# Altium integrated library Altium_WR-BHD (rev21a).IntLib: 216 symbols (part 2 of 2)
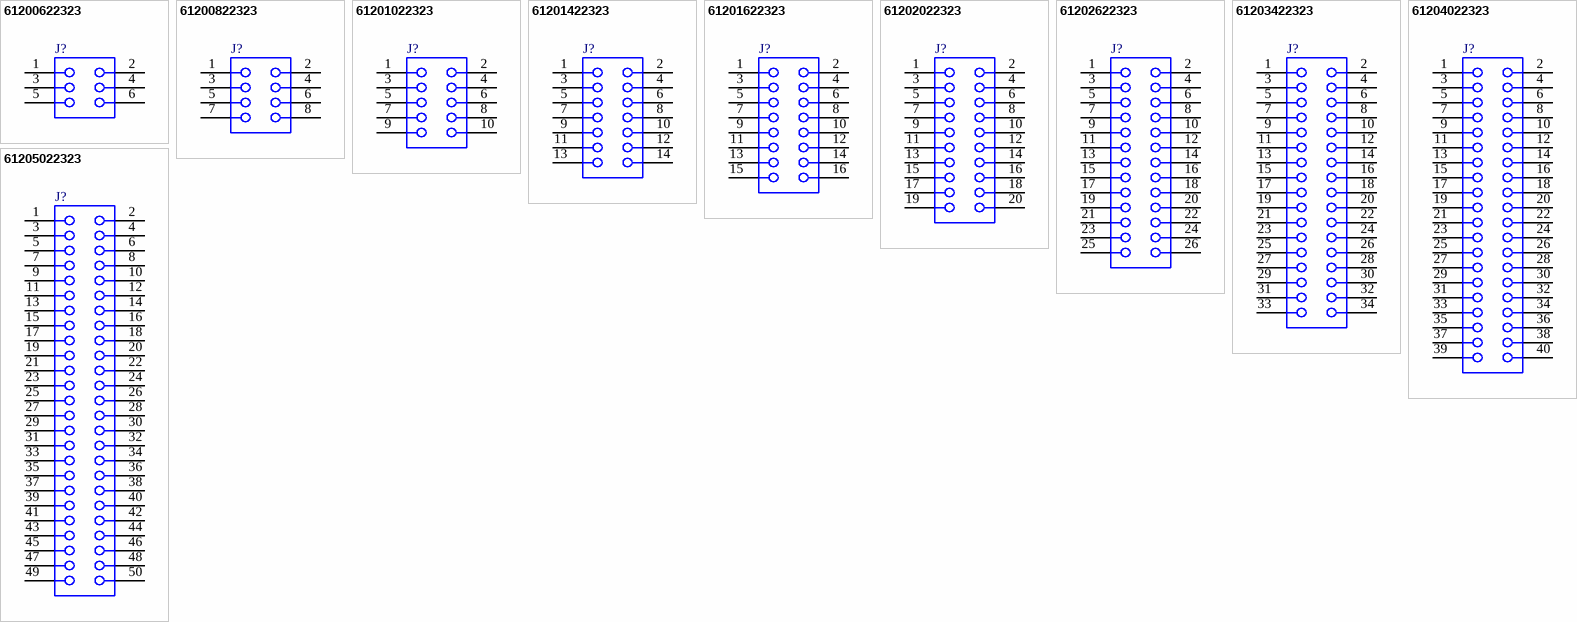
[diagram p9: symbols 61200622323 to 61205022323]

## 61203422323
designator J?
WR-BHD Box Header, Female Cable Side, pitch 2.54mm, THT, Straight, 34p; Manufacturer Part Number: 61203422323; Manufacturer: Wurth Elektronik; Pin Number: 34; Contact Resistance: 20mOhm; Working Voltage: 250VAC; Insulation Resistance: 1000MOhm; Rated Current: 1A; Withstanding Voltage: 500VAC; ComponentLink1Description: Manufacturer; ComponentLink1URL: http://www.we-online.de; ComponentLink2Description: Datasheet; ComponentLink2URL: https://www.we-online.com/catalog/datasheet/61203422323.pdf; Published Date: August 2021; Pitch: 2.54mm; Operating Temperature: -40 to +105degC; Mounting Technology: THT; Packaging: Tray; Gender: Female Cable Side; Length: 48.63mm; Type: Straight
footprint 61203422323
pins: 1, 2, 3, 4, 5, 6, 7, 8, 9, 10, 11, 12, 13, 14, 15, 16, 17, 18, 19, 20, 21, 22, 23, 24, 25, 26, 27, 28, 29, 30, 31, 32, 33, 34

## 61204022323
designator J?
WR-BHD Box Header, Female Cable Side, pitch 2.54mm, THT, Straight, 40p; Manufacturer Part Number: 61204022323; Manufacturer: Wurth Elektronik; Pin Number: 40; Contact Resistance: 20mOhm; Working Voltage: 250VAC; Insulation Resistance: 1000MOhm; Rated Current: 1A; Withstanding Voltage: 500VAC; ComponentLink1Description: Manufacturer; ComponentLink1URL: http://www.we-online.de; ComponentLink2Description: Datasheet; ComponentLink2URL: https://www.we-online.com/catalog/datasheet/61204022323.pdf; Published Date: August 2021; Pitch: 2.54mm; Operating Temperature: -40 to +105degC; Mounting Technology: THT; Packaging: Tray; Gender: Female Cable Side; Length: 56.25mm; Type: Straight
footprint 61204022323
pins: 1, 2, 3, 4, 5, 6, 7, 8, 9, 10, 11, 12, 13, 14, 15, 16, 17, 18, 19, 20, 21, 22, 23, 24, 25, 26, 27, 28, 29, 30, 31, 32, 33, 34, 35, 36, 37, 38, 39, 40

## 61205022323
designator J?
WR-BHD Box Header, Female Cable Side, pitch 2.54mm, THT, Straight, 50p; Manufacturer Part Number: 61205022323; Manufacturer: Wurth Elektronik; Pin Number: 50; Contact Resistance: 20mOhm; Working Voltage: 250VAC; Insulation Resistance: 1000MOhm; Rated Current: 1A; Withstanding Voltage: 500VAC; ComponentLink1Description: Manufacturer; ComponentLink1URL: http://www.we-online.de; ComponentLink2Description: Datasheet; ComponentLink2URL: https://www.we-online.com/catalog/datasheet/61205022323.pdf; Published Date: August 2021; Pitch: 2.54mm; Operating Temperature: -40 to +105degC; Mounting Technology: THT; Packaging: Tray; Gender: Female Cable Side; Length: 68.95mm; Type: Straight
footprint 61205022323
pins: 1, 2, 3, 4, 5, 6, 7, 8, 9, 10, 11, 12, 13, 14, 15, 16, 17, 18, 19, 20, 21, 22, 23, 24, 25, 26, 27, 28, 29, 30, 31, 32, 33, 34, 35, 36, 37, 38, 39, 40, 41, 42, 43, 44, 45, 46, 47, 48, 49, 50


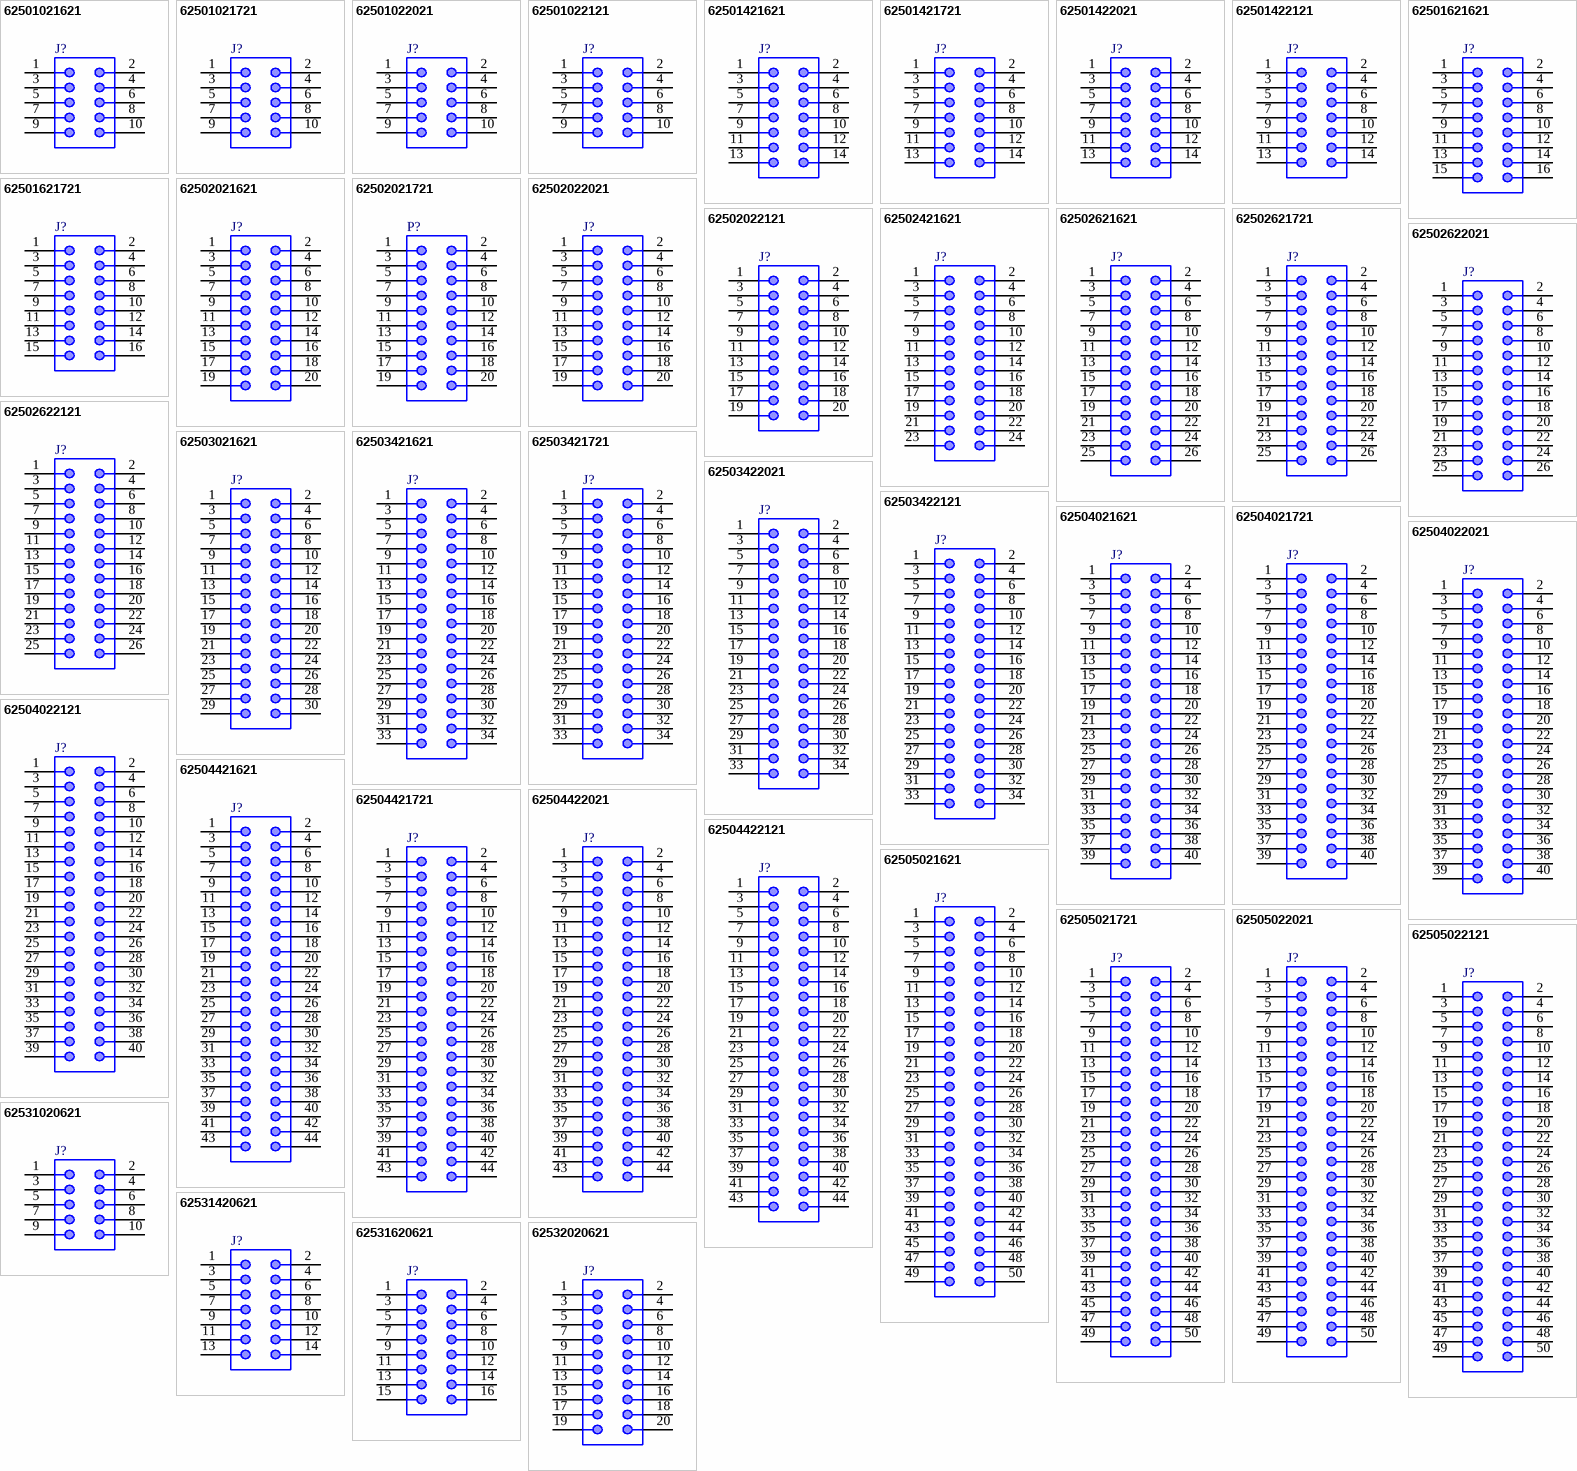
[diagram p4: symbols 62501021621 to 62532020621]

## 62501021621
designator J?
WR-BHD Box Header, Male PCB side, pitch 2.00mm, THT, Straight, 10p; Manufacturer Part Number: 62501021621; Manufacturer: Wurth Elektronik; Pin Number: 10; Working Voltage: 250VAC; Withstanding Voltage: 500VAC; Contact Resistance: 20mOhm; Insulation Resistance: 1000MOhm; Rated Current: 2A; ComponentLink1Description: Manufacturer; ComponentLink1URL: http://www.we-online.de; ComponentLink2Description: Datasheet; ComponentLink2URL: https://www.we-online.com/catalog/datasheet/62501021621.pdf; Published Date: August 2021; Pitch: 2.00mm; Operating Temperature: -40 to +125degC; Packaging: Tray; Gender: Male PCB side; Mounting Technology: THT; Type: Straight; Length: 17.2mm
footprint 62501021621
pins: 1, 2, 3, 4, 5, 6, 7, 8, 9, 10

## 62501021721
designator J?
WR-BHD Box Header, Male PCB side, pitch 2.00mm, THT, Angled, 10p; Manufacturer Part Number: 62501021721; Manufacturer: Wurth Elektronik; Pin Number: 10; Working Voltage: 250VAC; Withstanding Voltage: 500VAC; Contact Resistance: 20mOhm; Insulation Resistance: 1000MOhm; Rated Current: 2A; ComponentLink1Description: Manufacturer; ComponentLink1URL: http://www.we-online.de; ComponentLink2Description: Datasheet; ComponentLink2URL: https://www.we-online.com/catalog/datasheet/62501021721.pdf; Published Date: August 2021; Pitch: 2.00mm; Operating Temperature: -40 to +105degC; Packaging: Tray; Gender: Male PCB side; Mounting Technology: THT; Type: Angled; Length: 17.25mm
footprint 62501021721
pins: 1, 2, 3, 4, 5, 6, 7, 8, 9, 10

## 62501022021
designator J?
WR-BHD Box Header with Lever, Male PCB side, pitch 2.00mm, THT, Straight, 10p; Manufacturer Part Number: 62501022021; Manufacturer: Wurth Elektronik; Pin Number: 10; Working Voltage: 250VAC; Withstanding Voltage: 500VAC; Contact Resistance: 20mOhm; Insulation Resistance: 1000MOhm; Rated Current: 2A; ComponentLink1Description: Manufacturer; ComponentLink1URL: http://www.we-online.de; ComponentLink2Description: Datasheet; ComponentLink2URL: https://www.we-online.com/catalog/datasheet/62501022021.pdf; Published Date: August 2021; Pitch: 2.00mm; Operating Temperature: -40 to +105degC; Packaging: Tray; Gender: Male PCB side; Mounting Technology: THT; Type: Straight; Length: 25.7mm
footprint 62501022021
pins: 1, 2, 3, 4, 5, 6, 7, 8, 9, 10

## 62501022121
designator J?
WR-BHD Box Header with Lever, Male PCB side, pitch 2.00mm, THT, Angled, 10p; Manufacturer Part Number: 62501022121; Manufacturer: Wurth Elektronik; Pin Number: 10; Working Voltage: 250VAC; Withstanding Voltage: 500VAC; Contact Resistance: 20mOhm; Insulation Resistance: 1000MOhm; Rated Current: 2A; ComponentLink1Description: Manufacturer; ComponentLink1URL: http://www.we-online.de; ComponentLink2Description: Datasheet; ComponentLink2URL: https://www.we-online.com/catalog/datasheet/62501022121.pdf; Published Date: August 2021; Pitch: 2.00mm; Operating Temperature: -40 to +125degC; Packaging: Tray; Gender: Male PCB side; Mounting Technology: THT; Type: Angled; Length: 25.7mm
footprint 62501022121
pins: 1, 2, 3, 4, 5, 6, 7, 8, 9, 10

## 62501421621
designator J?
WR-BHD Box Header, Male PCB side, pitch 2.00mm, THT, Straight, 14p; Manufacturer Part Number: 62501421621; Manufacturer: Wurth Elektronik; Pin Number: 14; Working Voltage: 250VAC; Withstanding Voltage: 500VAC; Contact Resistance: 20mOhm; Insulation Resistance: 1000MOhm; Rated Current: 2A; ComponentLink1Description: Manufacturer; ComponentLink1URL: http://www.we-online.de; ComponentLink2Description: Datasheet; ComponentLink2URL: https://www.we-online.com/catalog/datasheet/62501421621.pdf; Published Date: August 2021; Pitch: 2.00mm; Operating Temperature: -40 to +125degC; Packaging: Tray; Gender: Male PCB side; Mounting Technology: THT; Type: Straight; Length: 21.2mm
footprint 62501421621
pins: 1, 2, 3, 4, 5, 6, 7, 8, 9, 10, 11, 12, 13, 14

## 62501421721
designator J?
WR-BHD Box Header, Male PCB side, pitch 2.00mm, THT, Angled, 14p; Manufacturer Part Number: 62501421721; Manufacturer: Wurth Elektronik; Pin Number: 14; Working Voltage: 250VAC; Withstanding Voltage: 500VAC; Contact Resistance: 20mOhm; Insulation Resistance: 1000MOhm; Rated Current: 2A; ComponentLink1Description: Manufacturer; ComponentLink1URL: http://www.we-online.de; ComponentLink2Description: Datasheet; ComponentLink2URL: https://www.we-online.com/catalog/datasheet/62501421721.pdf; Published Date: August 2021; Pitch: 2.00mm; Operating Temperature: -40 to +105degC; Packaging: Tray; Gender: Male PCB side; Mounting Technology: THT; Type: Angled; Length: 21.25mm
footprint 62501421721
pins: 1, 2, 3, 4, 5, 6, 7, 8, 9, 10, 11, 12, 13, 14

## 62501422021
designator J?
WR-BHD Box Header with Lever, Male PCB side, pitch 2.00mm, THT, Straight, 14p; Manufacturer Part Number: 62501422021; Manufacturer: Wurth Elektronik; Pin Number: 14; Working Voltage: 250VAC; Withstanding Voltage: 500VAC; Contact Resistance: 20mOhm; Insulation Resistance: 1000MOhm; Rated Current: 2A; ComponentLink1Description: Manufacturer; ComponentLink1URL: http://www.we-online.de; ComponentLink2Description: Datasheet; ComponentLink2URL: https://www.we-online.com/catalog/datasheet/62501422021.pdf; Published Date: August 2021; Pitch: 2.00mm; Operating Temperature: -40 to +105degC; Packaging: Tray; Gender: Male PCB side; Mounting Technology: THT; Type: Straight; Length: 29.7mm
footprint 62501422021
pins: 1, 2, 3, 4, 5, 6, 7, 8, 9, 10, 11, 12, 13, 14

## 62501422121
designator J?
WR-BHD Box Header with Lever, Male PCB side, pitch 2.00mm, THT, Angled, 14p; Manufacturer Part Number: 62501422121; Manufacturer: Wurth Elektronik; Pin Number: 14; Working Voltage: 250VAC; Withstanding Voltage: 500VAC; Contact Resistance: 20mOhm; Insulation Resistance: 1000MOhm; Rated Current: 2A; ComponentLink1Description: Manufacturer; ComponentLink1URL: http://www.we-online.de; ComponentLink2Description: Datasheet; ComponentLink2URL: https://www.we-online.com/catalog/datasheet/62501422121.pdf; Published Date: August 2021; Pitch: 2.00mm; Operating Temperature: -40 to +125degC; Packaging: Tray; Gender: Male PCB side; Mounting Technology: THT; Type: Angled; Length: 29.7mm
footprint 62501422121
pins: 1, 2, 3, 4, 5, 6, 7, 8, 9, 10, 11, 12, 13, 14

## 62501621621
designator J?
WR-BHD Box Header, Male PCB side, pitch 2.00mm, THT, Straight, 16p; Manufacturer Part Number: 62501621621; Manufacturer: Wurth Elektronik; Pin Number: 16; Working Voltage: 250VAC; Withstanding Voltage: 500VAC; Contact Resistance: 20mOhm; Insulation Resistance: 1000MOhm; Rated Current: 2A; ComponentLink1Description: Manufacturer; ComponentLink1URL: http://www.we-online.de; ComponentLink2Description: Datasheet; ComponentLink2URL: https://www.we-online.com/catalog/datasheet/62501621621.pdf; Published Date: August 2021; Pitch: 2.00mm; Operating Temperature: -40 to +125degC; Packaging: Tray; Gender: Male PCB side; Mounting Technology: THT; Type: Straight; Length: 23.2mm
footprint 62501621621
pins: 1, 2, 3, 4, 5, 6, 7, 8, 9, 10, 11, 12, 13, 14, 15, 16

## 62501621721
designator J?
WR-BHD Box Header, Male PCB side, pitch 2.00mm, THT, Angled, 16p; Manufacturer Part Number: 62501621721; Manufacturer: Wurth Elektronik; Pin Number: 16; Working Voltage: 250VAC; Withstanding Voltage: 500VAC; Contact Resistance: 20mOhm; Insulation Resistance: 1000MOhm; Rated Current: 2A; ComponentLink1Description: Manufacturer; ComponentLink1URL: http://www.we-online.de; ComponentLink2Description: Datasheet; ComponentLink2URL: https://www.we-online.com/catalog/datasheet/62501621721.pdf; Published Date: August 2021; Pitch: 2.00mm; Operating Temperature: -40 to +105degC; Packaging: Tray; Gender: Male PCB side; Mounting Technology: THT; Type: Angled; Length: 23.25mm
footprint 62501621721
pins: 1, 2, 3, 4, 5, 6, 7, 8, 9, 10, 11, 12, 13, 14, 15, 16

## 62502021621
designator J?
WR-BHD Box Header, Male PCB side, pitch 2.00mm, THT, Straight, 20p; Manufacturer Part Number: 62502021621; Manufacturer: Wurth Elektronik; Pin Number: 20; Working Voltage: 250VAC; Withstanding Voltage: 500VAC; Contact Resistance: 20mOhm; Insulation Resistance: 1000MOhm; Rated Current: 2A; ComponentLink1Description: Manufacturer; ComponentLink1URL: http://www.we-online.de; ComponentLink2Description: Datasheet; ComponentLink2URL: https://www.we-online.com/catalog/datasheet/62502021621.pdf; Published Date: August 2021; Pitch: 2.00mm; Operating Temperature: -40 to +125degC; Packaging: Tray; Gender: Male PCB side; Mounting Technology: THT; Type: Straight; Length: 27.2mm
footprint 62502021621
pins: 1, 2, 3, 4, 5, 6, 7, 8, 9, 10, 11, 12, 13, 14, 15, 16, 17, 18, 19, 20

## 62502021721
designator P?
WR-BHD Box Header, Male PCB side, pitch 2.00mm, THT, Angled, 20p; Manufacturer Part Number: 62502021721; Manufacturer: Wurth Elektronik; Pin Number: 20; Working Voltage: 250VAC; Withstanding Voltage: 500VAC; Contact Resistance: 20mOhm; Insulation Resistance: 1000MOhm; Rated Current: 2A; ComponentLink1Description: Manufacturer; ComponentLink1URL: http://www.we-online.de; ComponentLink2Description: Datasheet; ComponentLink2URL: https://www.we-online.com/catalog/datasheet/62502021721.pdf; Published Date: August 2021; Pitch: 2.00mm; Operating Temperature: -40 to +105degC; Packaging: Tray; Gender: Male PCB side; Mounting Technology: THT; Type: Angled; Length: 27.25mm
footprint 62502021721
pins: 1, 2, 3, 4, 5, 6, 7, 8, 9, 10, 11, 12, 13, 14, 15, 16, 17, 18, 19, 20

## 62502022021
designator J?
WR-BHD Box Header with Lever, Male PCB side, pitch 2.00mm, THT, Straight, 20p; Manufacturer Part Number: 62502022021; Manufacturer: Wurth Elektronik; Pin Number: 20; Working Voltage: 250VAC; Withstanding Voltage: 500VAC; Contact Resistance: 20mOhm; Insulation Resistance: 1000MOhm; Rated Current: 2A; ComponentLink1Description: Manufacturer; ComponentLink1URL: http://www.we-online.de; ComponentLink2Description: Datasheet; ComponentLink2URL: https://www.we-online.com/catalog/datasheet/62502022021.pdf; Published Date: August 2021; Pitch: 2.00mm; Operating Temperature: -40 to +105degC; Packaging: Tray; Gender: Male PCB side; Mounting Technology: THT; Type: Straight; Length: 35.7mm
footprint 62502022021
pins: 1, 2, 3, 4, 5, 6, 7, 8, 9, 10, 11, 12, 13, 14, 15, 16, 17, 18, 19, 20

## 62502022121
designator J?
WR-BHD Box Header with Lever, Male PCB side, pitch 2.00mm, THT, Angled, 20p; Manufacturer Part Number: 62502022121; Manufacturer: Wurth Elektronik; Pin Number: 20; Working Voltage: 250VAC; Withstanding Voltage: 500VAC; Contact Resistance: 20mOhm; Insulation Resistance: 1000MOhm; Rated Current: 2A; ComponentLink1Description: Manufacturer; ComponentLink1URL: http://www.we-online.de; ComponentLink2Description: Datasheet; ComponentLink2URL: https://www.we-online.com/catalog/datasheet/62502022121.pdf; Published Date: August 2021; Pitch: 2.00mm; Operating Temperature: -40 to +125degC; Packaging: Tray; Gender: Male PCB side; Mounting Technology: THT; Type: Angled; Length: 35.7mm
footprint 62502022121
pins: 1, 2, 3, 4, 5, 6, 7, 8, 9, 10, 11, 12, 13, 14, 15, 16, 17, 18, 19, 20

## 62502421621
designator J?
WR-BHD Box Header, Male PCB side, pitch 2.00mm, THT, Straight, 24p; Manufacturer Part Number: 62502421621; Manufacturer: Wurth Elektronik; Pin Number: 24; Working Voltage: 250VAC; Withstanding Voltage: 500VAC; Contact Resistance: 20mOhm; Insulation Resistance: 1000MOhm; Rated Current: 2A; ComponentLink1Description: Manufacturer; ComponentLink1URL: http://www.we-online.de; ComponentLink2Description: Datasheet; ComponentLink2URL: https://www.we-online.com/catalog/datasheet/62502421621.pdf; Published Date: August 2021; Pitch: 2.00mm; Operating Temperature: -40 to +125degC; Packaging: Tray; Gender: Male PCB side; Mounting Technology: THT; Type: Straight; Length: 32.2mm
footprint 62502421621
pins: 1, 2, 3, 4, 5, 6, 7, 8, 9, 10, 11, 12, 13, 14, 15, 16, 17, 18, 19, 20, 21, 22, 23, 24

## 62502621621
designator J?
WR-BHD Box Header, Male PCB side, pitch 2.00mm, THT, Straight, 26p; Manufacturer Part Number: 62502621621; Manufacturer: Wurth Elektronik; Pin Number: 26; Working Voltage: 250VAC; Withstanding Voltage: 500VAC; Contact Resistance: 20mOhm; Insulation Resistance: 1000MOhm; Rated Current: 2A; ComponentLink1Description: Manufacturer; ComponentLink1URL: http://www.we-online.de; ComponentLink2Description: Datasheet; ComponentLink2URL: https://www.we-online.com/catalog/datasheet/62502621621.pdf; Published Date: August 2021; Pitch: 2.00mm; Operating Temperature: -40 to +125degC; Packaging: Tray; Gender: Male PCB side; Mounting Technology: THT; Type: Straight; Length: 33.2mm
footprint 62502621621
pins: 1, 2, 3, 4, 5, 6, 7, 8, 9, 10, 11, 12, 13, 14, 15, 16, 17, 18, 19, 20, 21, 22, 23, 24, 25, 26

## 62502621721
designator J?
WR-BHD Box Header, Male PCB side, pitch 2.00mm, THT, Angled, 26p; Manufacturer Part Number: 62502621721; Manufacturer: Wurth Elektronik; Pin Number: 26; Working Voltage: 250VAC; Withstanding Voltage: 500VAC; Contact Resistance: 20mOhm; Insulation Resistance: 1000MOhm; Rated Current: 2A; ComponentLink1Description: Manufacturer; ComponentLink1URL: http://www.we-online.de; ComponentLink2Description: Datasheet; ComponentLink2URL: https://www.we-online.com/catalog/datasheet/62502621721.pdf; Published Date: August 2021; Pitch: 2.00mm; Operating Temperature: -40 to +105degC; Packaging: Tray; Gender: Male PCB side; Mounting Technology: THT; Type: Angled; Length: 33.25mm
footprint 62502621721
pins: 1, 2, 3, 4, 5, 6, 7, 8, 9, 10, 11, 12, 13, 14, 15, 16, 17, 18, 19, 20, 21, 22, 23, 24, 25, 26

## 62502622021
designator J?
WR-BHD Box Header with Lever, Male PCB side, pitch 2.00mm, THT, Straight, 26p; Manufacturer Part Number: 62502622021; Manufacturer: Wurth Elektronik; Pin Number: 26; Working Voltage: 250VAC; Withstanding Voltage: 500VAC; Contact Resistance: 20mOhm; Insulation Resistance: 1000MOhm; Rated Current: 2A; ComponentLink1Description: Manufacturer; ComponentLink1URL: http://www.we-online.de; ComponentLink2Description: Datasheet; ComponentLink2URL: https://www.we-online.com/catalog/datasheet/62502622021.pdf; Published Date: August 2021; Pitch: 2.00mm; Operating Temperature: -40 to +105degC; Packaging: Tray; Gender: Male PCB side; Mounting Technology: THT; Type: Straight; Length: 41.7mm
footprint 62502622021
pins: 1, 2, 3, 4, 5, 6, 7, 8, 9, 10, 11, 12, 13, 14, 15, 16, 17, 18, 19, 20, 21, 22, 23, 24, 25, 26

## 62502622121
designator J?
WR-BHD Box Header with Lever, Male PCB side, pitch 2.00mm, THT, Angled, 26p; Manufacturer Part Number: 62502622121; Manufacturer: Wurth Elektronik; Pin Number: 26; Working Voltage: 250VAC; Withstanding Voltage: 500VAC; Contact Resistance: 20mOhm; Insulation Resistance: 1000MOhm; Rated Current: 2A; ComponentLink1Description: Manufacturer; ComponentLink1URL: http://www.we-online.de; ComponentLink2Description: Datasheet; ComponentLink2URL: https://www.we-online.com/catalog/datasheet/62502622121.pdf; Published Date: August 2021; Pitch: 2.00mm; Operating Temperature: -40 to +125degC; Packaging: Tray; Gender: Male PCB side; Mounting Technology: THT; Type: Angled; Length: 41.7mm
footprint 62502622121
pins: 1, 2, 3, 4, 5, 6, 7, 8, 9, 10, 11, 12, 13, 14, 15, 16, 17, 18, 19, 20, 21, 22, 23, 24, 25, 26

## 62503021621
designator J?
WR-BHD Box Header, Male PCB side, pitch 2.00mm, THT, Straight, 30p; Manufacturer Part Number: 62503021621; Manufacturer: Wurth Elektronik; Pin Number: 30; Working Voltage: 250VAC; Withstanding Voltage: 500VAC; Contact Resistance: 20mOhm; Insulation Resistance: 1000MOhm; Rated Current: 2A; ComponentLink1Description: Manufacturer; ComponentLink1URL: http://www.we-online.de; ComponentLink2Description: Datasheet; ComponentLink2URL: https://www.we-online.com/catalog/datasheet/62503021621.pdf; Published Date: August 2021; Pitch: 2.00mm; Operating Temperature: -40 to +125degC; Packaging: Tray; Gender: Male PCB side; Mounting Technology: THT; Type: Straight; Length: 37.2mm
footprint 62503021621
pins: 1, 2, 3, 4, 5, 6, 7, 8, 9, 10, 11, 12, 13, 14, 15, 16, 17, 18, 19, 20, 21, 22, 23, 24, 25, 26, 27, 28, 29, 30

## 62503421621
designator J?
WR-BHD Box Header, Male PCB side, pitch 2.00mm, THT, Straight, 34p; Manufacturer Part Number: 62503421621; Manufacturer: Wurth Elektronik; Pin Number: 34; Working Voltage: 250VAC; Withstanding Voltage: 500VAC; Contact Resistance: 20mOhm; Insulation Resistance: 1000MOhm; Rated Current: 2A; ComponentLink1Description: Manufacturer; ComponentLink1URL: http://www.we-online.de; ComponentLink2Description: Datasheet; ComponentLink2URL: https://www.we-online.com/catalog/datasheet/62503421621.pdf; Published Date: August 2021; Pitch: 2.00mm; Operating Temperature: -40 to +125degC; Packaging: Tray; Gender: Male PCB side; Mounting Technology: THT; Type: Straight; Length: 41.2mm
footprint 62503421621
pins: 1, 2, 3, 4, 5, 6, 7, 8, 9, 10, 11, 12, 13, 14, 15, 16, 17, 18, 19, 20, 21, 22, 23, 24, 25, 26, 27, 28, 29, 30, 31, 32, 33, 34

## 62503421721
designator J?
WR-BHD Box Header, Male PCB side, pitch 2.00mm, THT, Angled, 34p; Manufacturer Part Number: 62503421721; Manufacturer: Wurth Elektronik; Pin Number: 34; Working Voltage: 250VAC; Withstanding Voltage: 500VAC; Contact Resistance: 20mOhm; Insulation Resistance: 1000MOhm; Rated Current: 2A; ComponentLink1Description: Manufacturer; ComponentLink1URL: http://www.we-online.de; ComponentLink2Description: Datasheet; ComponentLink2URL: https://www.we-online.com/catalog/datasheet/62503421721.pdf; Published Date: August 2021; Pitch: 2.00mm; Operating Temperature: -40 to +105degC; Packaging: Tray; Gender: Male PCB side; Mounting Technology: THT; Type: Angled; Length: 41.25mm
footprint 62503421721
pins: 1, 2, 3, 4, 5, 6, 7, 8, 9, 10, 11, 12, 13, 14, 15, 16, 17, 18, 19, 20, 21, 22, 23, 24, 25, 26, 27, 28, 29, 30, 31, 32, 33, 34

## 62503422021
designator J?
WR-BHD Box Header with Lever, Male PCB side, pitch 2.00mm, THT, Straight, 34p; Manufacturer Part Number: 62503422021; Manufacturer: Wurth Elektronik; Pin Number: 34; Working Voltage: 250VAC; Withstanding Voltage: 500VAC; Contact Resistance: 20mOhm; Insulation Resistance: 1000MOhm; Rated Current: 2A; ComponentLink1Description: Manufacturer; ComponentLink1URL: http://www.we-online.de; ComponentLink2Description: Datasheet; ComponentLink2URL: https://www.we-online.com/catalog/datasheet/62503422021.pdf; Published Date: August 2021; Pitch: 2.00mm; Operating Temperature: -40 to +105degC; Packaging: Tray; Gender: Male PCB side; Mounting Technology: THT; Type: Straight; Length: 49.7mm
footprint 62503422021
pins: 1, 2, 3, 4, 5, 6, 7, 8, 9, 10, 11, 12, 13, 14, 15, 16, 17, 18, 19, 20, 21, 22, 23, 24, 25, 26, 27, 28, 29, 30, 31, 32, 33, 34

## 62503422121
designator J?
WR-BHD Box Header with Lever, Male PCB side, pitch 2.00mm, THT, Angled, 34p; Manufacturer Part Number: 62503422121; Manufacturer: Wurth Elektronik; Pin Number: 34; Working Voltage: 250VAC; Withstanding Voltage: 500VAC; Contact Resistance: 20mOhm; Insulation Resistance: 1000MOhm; Rated Current: 2A; ComponentLink1Description: Manufacturer; ComponentLink1URL: http://www.we-online.de; ComponentLink2Description: Datasheet; ComponentLink2URL: https://www.we-online.com/catalog/datasheet/62503422121.pdf; Published Date: August 2021; Pitch: 2.00mm; Operating Temperature: -40 to +125degC; Packaging: Tray; Gender: Male PCB side; Mounting Technology: THT; Type: Angled; Length: 49.7mm
footprint 62503422121
pins: 1, 2, 3, 4, 5, 6, 7, 8, 9, 10, 11, 12, 13, 14, 15, 16, 17, 18, 19, 20, 21, 22, 23, 24, 25, 26, 27, 28, 29, 30, 31, 32, 33, 34

## 62504021621
designator J?
WR-BHD Box Header, Male PCB side, pitch 2.00mm, THT, Straight, 40p; Manufacturer Part Number: 62504021621; Manufacturer: Wurth Elektronik; Pin Number: 40; Working Voltage: 250VAC; Withstanding Voltage: 500VAC; Contact Resistance: 20mOhm; Insulation Resistance: 1000MOhm; Rated Current: 2A; ComponentLink1Description: Manufacturer; ComponentLink1URL: http://www.we-online.de; ComponentLink2Description: Datasheet; ComponentLink2URL: https://www.we-online.com/catalog/datasheet/62504021621.pdf; Published Date: August 2021; Pitch: 2.00mm; Operating Temperature: -40 to +125degC; Packaging: Tray; Gender: Male PCB side; Mounting Technology: THT; Type: Straight; Length: 47.2mm
footprint 62504021621
pins: 1, 2, 3, 4, 5, 6, 7, 8, 9, 10, 11, 12, 13, 14, 15, 16, 17, 18, 19, 20, 21, 22, 23, 24, 25, 26, 27, 28, 29, 30, 31, 32, 33, 34, 35, 36, 37, 38, 39, 40

## 62504021721
designator J?
WR-BHD Box Header, Male PCB side, pitch 2.00mm, THT, Angled, 40p; Manufacturer Part Number: 62504021721; Manufacturer: Wurth Elektronik; Pin Number: 40; Working Voltage: 250VAC; Withstanding Voltage: 500VAC; Contact Resistance: 20mOhm; Insulation Resistance: 1000MOhm; Rated Current: 2A; ComponentLink1Description: Manufacturer; ComponentLink1URL: http://www.we-online.de; ComponentLink2Description: Datasheet; ComponentLink2URL: https://www.we-online.com/catalog/datasheet/62504021721.pdf; Published Date: August 2021; Pitch: 2.00mm; Operating Temperature: -40 to +105degC; Packaging: Tray; Gender: Male PCB side; Mounting Technology: THT; Type: Angled; Length: 47.25mm
footprint 62504021721
pins: 1, 2, 3, 4, 5, 6, 7, 8, 9, 10, 11, 12, 13, 14, 15, 16, 17, 18, 19, 20, 21, 22, 23, 24, 25, 26, 27, 28, 29, 30, 31, 32, 33, 34, 35, 36, 37, 38, 39, 40

## 62504022021
designator J?
WR-BHD Box Header with Lever, Male PCB side, pitch 2.00mm, THT, Straight, 40p; Manufacturer Part Number: 62504022021; Manufacturer: Wurth Elektronik; Pin Number: 40; Working Voltage: 250VAC; Withstanding Voltage: 500VAC; Contact Resistance: 20mOhm; Insulation Resistance: 1000MOhm; Rated Current: 2A; ComponentLink1Description: Manufacturer; ComponentLink1URL: http://www.we-online.de; ComponentLink2Description: Datasheet; ComponentLink2URL: https://www.we-online.com/catalog/datasheet/62504022021.pdf; Published Date: August 2021; Pitch: 2.00mm; Operating Temperature: -40 to +105degC; Packaging: Tray; Gender: Male PCB side; Mounting Technology: THT; Type: Straight; Length: 55.7mm
footprint 62504022021
pins: 1, 2, 3, 4, 5, 6, 7, 8, 9, 10, 11, 12, 13, 14, 15, 16, 17, 18, 19, 20, 21, 22, 23, 24, 25, 26, 27, 28, 29, 30, 31, 32, 33, 34, 35, 36, 37, 38, 39, 40

## 62504022121
designator J?
WR-BHD Box Header with Lever, Male PCB side, pitch 2.00mm, THT, Angled, 40p; Manufacturer Part Number: 62504022121; Manufacturer: Wurth Elektronik; Pin Number: 40; Working Voltage: 250VAC; Withstanding Voltage: 500VAC; Contact Resistance: 20mOhm; Insulation Resistance: 1000MOhm; Rated Current: 2A; ComponentLink1Description: Manufacturer; ComponentLink1URL: http://www.we-online.de; ComponentLink2Description: Datasheet; ComponentLink2URL: https://www.we-online.com/catalog/datasheet/62504022121.pdf; Published Date: August 2021; Pitch: 2.00mm; Operating Temperature: -40 to +125degC; Packaging: Tray; Gender: Male PCB side; Mounting Technology: THT; Type: Angled; Length: 55.7mm
footprint 62504022121
pins: 1, 2, 3, 4, 5, 6, 7, 8, 9, 10, 11, 12, 13, 14, 15, 16, 17, 18, 19, 20, 21, 22, 23, 24, 25, 26, 27, 28, 29, 30, 31, 32, 33, 34, 35, 36, 37, 38, 39, 40

## 62504421621
designator J?
WR-BHD Box Header, Male PCB side, pitch 2.00mm, THT, Straight, 44p; Manufacturer Part Number: 62504421621; Manufacturer: Wurth Elektronik; Pin Number: 44; Working Voltage: 250VAC; Withstanding Voltage: 500VAC; Contact Resistance: 20mOhm; Insulation Resistance: 1000MOhm; Rated Current: 2A; ComponentLink1Description: Manufacturer; ComponentLink1URL: http://www.we-online.de; ComponentLink2Description: Datasheet; ComponentLink2URL: https://www.we-online.com/catalog/datasheet/62504421621.pdf; Published Date: August 2021; Pitch: 2.00mm; Operating Temperature: -40 to +125degC; Packaging: Tray; Gender: Male PCB side; Mounting Technology: THT; Type: Straight; Length: 51.2mm
footprint 62504421621
pins: 1, 2, 3, 4, 5, 6, 7, 8, 9, 10, 11, 12, 13, 14, 15, 16, 17, 18, 19, 20, 21, 22, 23, 24, 25, 26, 27, 28, 29, 30, 31, 32, 33, 34, 35, 36, 37, 38, 39, 40, 41, 42, 43, 44

## 62504421721
designator J?
WR-BHD Box Header, Male PCB side, pitch 2.00mm, THT, Angled, 44p; Manufacturer Part Number: 62504421721; Manufacturer: Wurth Elektronik; Pin Number: 44; Working Voltage: 250VAC; Withstanding Voltage: 500VAC; Contact Resistance: 20mOhm; Insulation Resistance: 1000MOhm; Rated Current: 2A; ComponentLink1Description: Manufacturer; ComponentLink1URL: http://www.we-online.de; ComponentLink2Description: Datasheet; ComponentLink2URL: https://www.we-online.com/catalog/datasheet/62504421721.pdf; Published Date: August 2021; Pitch: 2.00mm; Operating Temperature: -40 to +105degC; Packaging: Tray; Gender: Male PCB side; Mounting Technology: THT; Type: Angled; Length: 51.25mm
footprint 62504421721
pins: 1, 2, 3, 4, 5, 6, 7, 8, 9, 10, 11, 12, 13, 14, 15, 16, 17, 18, 19, 20, 21, 22, 23, 24, 25, 26, 27, 28, 29, 30, 31, 32, 33, 34, 35, 36, 37, 38, 39, 40, 41, 42, 43, 44

## 62504422021
designator J?
WR-BHD Box Header with Lever, Male PCB side, pitch 2.00mm, THT, Straight, 44p; Manufacturer Part Number: 62504422021; Manufacturer: Wurth Elektronik; Pin Number: 44; Working Voltage: 250VAC; Withstanding Voltage: 500VAC; Contact Resistance: 20mOhm; Insulation Resistance: 1000MOhm; Rated Current: 2A; ComponentLink1Description: Manufacturer; ComponentLink1URL: http://www.we-online.de; ComponentLink2Description: Datasheet; ComponentLink2URL: https://www.we-online.com/catalog/datasheet/62504422021.pdf; Published Date: August 2021; Pitch: 2.00mm; Operating Temperature: -40 to +105degC; Packaging: Tray; Gender: Male PCB side; Mounting Technology: THT; Type: Straight; Length: 59.7mm
footprint 62504422021
pins: 1, 2, 3, 4, 5, 6, 7, 8, 9, 10, 11, 12, 13, 14, 15, 16, 17, 18, 19, 20, 21, 22, 23, 24, 25, 26, 27, 28, 29, 30, 31, 32, 33, 34, 35, 36, 37, 38, 39, 40, 41, 42, 43, 44

## 62504422121
designator J?
WR-BHD Box Header with Lever, Male PCB side, pitch 2.00mm, THT, Angled, 44p; Manufacturer Part Number: 62504422121; Manufacturer: Wurth Elektronik; Pin Number: 44; Working Voltage: 250VAC; Withstanding Voltage: 500VAC; Contact Resistance: 20mOhm; Insulation Resistance: 1000MOhm; Rated Current: 2A; ComponentLink1Description: Manufacturer; ComponentLink1URL: http://www.we-online.de; ComponentLink2Description: Datasheet; ComponentLink2URL: https://www.we-online.com/catalog/datasheet/62504422121.pdf; Published Date: August 2021; Pitch: 2.00mm; Operating Temperature: -40 to +125degC; Packaging: Tray; Gender: Male PCB side; Mounting Technology: THT; Type: Angled; Length: 59.7mm
footprint 62504422121
pins: 1, 2, 3, 4, 5, 6, 7, 8, 9, 10, 11, 12, 13, 14, 15, 16, 17, 18, 19, 20, 21, 22, 23, 24, 25, 26, 27, 28, 29, 30, 31, 32, 33, 34, 35, 36, 37, 38, 39, 40, 41, 42, 43, 44

## 62505021621
designator J?
WR-BHD Box Header, Male PCB side, pitch 2.00mm, THT, Straight, 50p; Manufacturer Part Number: 62505021621; Manufacturer: Wurth Elektronik; Pin Number: 50; Working Voltage: 250VAC; Withstanding Voltage: 500VAC; Contact Resistance: 20mOhm; Insulation Resistance: 1000MOhm; Rated Current: 2A; ComponentLink1Description: Manufacturer; ComponentLink1URL: http://www.we-online.de; ComponentLink2Description: Datasheet; ComponentLink2URL: https://www.we-online.com/catalog/datasheet/62505021621.pdf; Published Date: August 2021; Pitch: 2.00mm; Operating Temperature: -40 to +125degC; Packaging: Tray; Gender: Male PCB side; Mounting Technology: THT; Type: Straight; Length: 57.2mm
footprint 62505021621
pins: 1, 2, 3, 4, 5, 6, 7, 8, 9, 10, 11, 12, 13, 14, 15, 16, 17, 18, 19, 20, 21, 22, 23, 24, 25, 26, 27, 28, 29, 30, 31, 32, 33, 34, 35, 36, 37, 38, 39, 40, 41, 42, 43, 44, 45, 46, 47, 48, 49, 50

## 62505021721
designator J?
WR-BHD Box Header, Male PCB side, pitch 2.00mm, THT, Angled, 50p; Manufacturer Part Number: 62505021721; Manufacturer: Wurth Elektronik; Pin Number: 50; Working Voltage: 250VAC; Withstanding Voltage: 500VAC; Contact Resistance: 20mOhm; Insulation Resistance: 1000MOhm; Rated Current: 2A; ComponentLink1Description: Manufacturer; ComponentLink1URL: http://www.we-online.de; ComponentLink2Description: Datasheet; ComponentLink2URL: https://www.we-online.com/catalog/datasheet/62505021721.pdf; Published Date: August 2021; Pitch: 2.00mm; Operating Temperature: -40 to +105degC; Packaging: Tray; Gender: Male PCB side; Mounting Technology: THT; Type: Angled; Length: 57.25mm
footprint 62505021721
pins: 1, 2, 3, 4, 5, 6, 7, 8, 9, 10, 11, 12, 13, 14, 15, 16, 17, 18, 19, 20, 21, 22, 23, 24, 25, 26, 27, 28, 29, 30, 31, 32, 33, 34, 35, 36, 37, 38, 39, 40, 41, 42, 43, 44, 45, 46, 47, 48, 49, 50

## 62505022021
designator J?
WR-BHD Box Header with Lever, Male PCB side, pitch 2.00mm, THT, Straight, 50p; Manufacturer Part Number: 62505022021; Manufacturer: Wurth Elektronik; Pin Number: 50; Working Voltage: 250VAC; Withstanding Voltage: 500VAC; Contact Resistance: 20mOhm; Insulation Resistance: 1000MOhm; Rated Current: 2A; ComponentLink1Description: Manufacturer; ComponentLink1URL: http://www.we-online.de; ComponentLink2Description: Datasheet; ComponentLink2URL: https://www.we-online.com/catalog/datasheet/62505022021.pdf; Published Date: August 2021; Pitch: 2.00mm; Operating Temperature: -40 to +105degC; Packaging: Tray; Gender: Male PCB side; Mounting Technology: THT; Type: Straight; Length: 65.7mm
footprint 62505022021
pins: 1, 2, 3, 4, 5, 6, 7, 8, 9, 10, 11, 12, 13, 14, 15, 16, 17, 18, 19, 20, 21, 22, 23, 24, 25, 26, 27, 28, 29, 30, 31, 32, 33, 34, 35, 36, 37, 38, 39, 40, 41, 42, 43, 44, 45, 46, 47, 48, 49, 50

## 62505022121
designator J?
WR-BHD Box Header with Lever, Male PCB side, pitch 2.00mm, THT, Angled, 50p; Manufacturer Part Number: 62505022121; Manufacturer: Wurth Elektronik; Pin Number: 50; Working Voltage: 250VAC; Withstanding Voltage: 500VAC; Contact Resistance: 20mOhm; Insulation Resistance: 1000MOhm; Rated Current: 2A; ComponentLink1Description: Manufacturer; ComponentLink1URL: http://www.we-online.de; ComponentLink2Description: Datasheet; ComponentLink2URL: https://www.we-online.com/catalog/datasheet/62505022121.pdf; Published Date: August 2021; Pitch: 2.00mm; Operating Temperature: -40 to +125degC; Packaging: Tray; Gender: Male PCB side; Mounting Technology: THT; Type: Angled; Length: 65.7mm
footprint 62505022121
pins: 1, 2, 3, 4, 5, 6, 7, 8, 9, 10, 11, 12, 13, 14, 15, 16, 17, 18, 19, 20, 21, 22, 23, 24, 25, 26, 27, 28, 29, 30, 31, 32, 33, 34, 35, 36, 37, 38, 39, 40, 41, 42, 43, 44, 45, 46, 47, 48, 49, 50

## 62531020621
designator J?
WR-BHD Box Header, Male PCB side, pitch 2.00mm, SMT, Straight, 10p; Manufacturer Part Number: 62531020621; Manufacturer: Wurth Elektronik; Pin Number: 10; Working Voltage: 250VAC; Withstanding Voltage: 500VAC; Contact Resistance: 20mOhm; Insulation Resistance: 1000MOhm; Rated Current: 2A; ComponentLink1Description: Manufacturer; ComponentLink1URL: http://www.we-online.de; ComponentLink2Description: Datasheet; ComponentLink2URL: https://www.we-online.com/catalog/datasheet/62531020621.pdf; Published Date: August 2021; Pitch: 2.00mm; Operating Temperature: -40 to +105degC; Packaging: Tape and Reel with Cap; Gender: Male PCB side; Mounting Technology: SMT; Type: Straight; Length: 17.25mm
footprint 62531020621
pins: 1, 2, 3, 4, 5, 6, 7, 8, 9, 10

## 62531420621
designator J?
WR-BHD Box Header, Male PCB side, pitch 2.00mm, SMT, Straight, 14p; Manufacturer Part Number: 62531420621; Manufacturer: Wurth Elektronik; Pin Number: 14; Working Voltage: 250VAC; Withstanding Voltage: 500VAC; Contact Resistance: 20mOhm; Insulation Resistance: 1000MOhm; Rated Current: 2A; ComponentLink1Description: Manufacturer; ComponentLink1URL: http://www.we-online.de; ComponentLink2Description: Datasheet; ComponentLink2URL: https://www.we-online.com/catalog/datasheet/62531420621.pdf; Published Date: August 2021; Pitch: 2.00mm; Operating Temperature: -40 to +105degC; Packaging: Tape and Reel with Cap; Gender: Male PCB side; Mounting Technology: SMT; Type: Straight; Length: 21.25mm
footprint 62531420621
pins: 1, 2, 3, 4, 5, 6, 7, 8, 9, 10, 11, 12, 13, 14

## 62531620621
designator J?
WR-BHD Box Header, Male PCB side, pitch 2.00mm, SMT, Straight, 16p; Manufacturer Part Number: 62531620621; Manufacturer: Wurth Elektronik; Pin Number: 16; Working Voltage: 250VAC; Withstanding Voltage: 500VAC; Contact Resistance: 20mOhm; Insulation Resistance: 1000MOhm; Rated Current: 2A; ComponentLink1Description: Manufacturer; ComponentLink1URL: http://www.we-online.de; ComponentLink2Description: Datasheet; ComponentLink2URL: https://www.we-online.com/catalog/datasheet/62531620621.pdf; Published Date: August 2021; Pitch: 2.00mm; Operating Temperature: -40 to +105degC; Packaging: Tape and Reel with Cap; Gender: Male PCB side; Mounting Technology: SMT; Type: Straight; Length: 23.25mm
footprint 62531620621
pins: 1, 2, 3, 4, 5, 6, 7, 8, 9, 10, 11, 12, 13, 14, 15, 16

## 62532020621
designator J?
WR-BHD Box Header, Male PCB side, pitch 2.00mm, SMT, Straight, 20p; Manufacturer Part Number: 62532020621; Manufacturer: Wurth Elektronik; Pin Number: 20; Working Voltage: 250VAC; Withstanding Voltage: 500VAC; Contact Resistance: 20mOhm; Insulation Resistance: 1000MOhm; Rated Current: 2A; ComponentLink1Description: Manufacturer; ComponentLink1URL: http://www.we-online.de; ComponentLink2Description: Datasheet; ComponentLink2URL: https://www.we-online.com/catalog/datasheet/62532020621.pdf; Published Date: August 2021; Pitch: 2.00mm; Operating Temperature: -40 to +105degC; Packaging: Tape and Reel with Cap; Gender: Male PCB side; Mounting Technology: SMT; Type: Straight; Length: 27.25mm
footprint 62532020621
pins: 1, 2, 3, 4, 5, 6, 7, 8, 9, 10, 11, 12, 13, 14, 15, 16, 17, 18, 19, 20

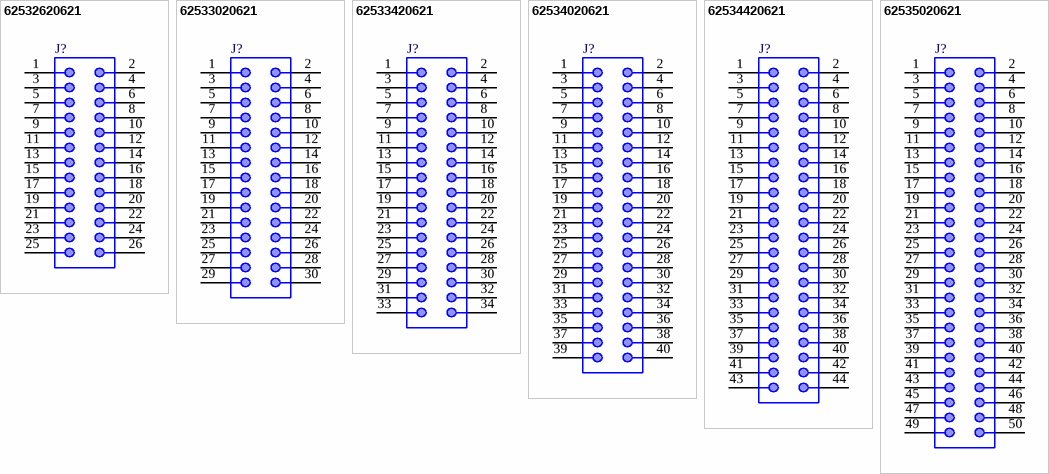
[diagram p5: symbols 62532620621 to 62535020621]

## 62532620621
designator J?
WR-BHD Box Header, Male PCB side, pitch 2.00mm, SMT, Straight, 26p; Manufacturer Part Number: 62532620621; Manufacturer: Wurth Elektronik; Pin Number: 26; Working Voltage: 250VAC; Withstanding Voltage: 500VAC; Contact Resistance: 20mOhm; Insulation Resistance: 1000MOhm; Rated Current: 2A; ComponentLink1Description: Manufacturer; ComponentLink1URL: http://www.we-online.de; ComponentLink2Description: Datasheet; ComponentLink2URL: https://www.we-online.com/catalog/datasheet/62532620621.pdf; Published Date: August 2021; Pitch: 2.00mm; Operating Temperature: -40 to +105degC; Packaging: Tape and Reel with Cap; Gender: Male PCB side; Mounting Technology: SMT; Type: Straight; Length: 33.25mm
footprint 62532620621
pins: 1, 2, 3, 4, 5, 6, 7, 8, 9, 10, 11, 12, 13, 14, 15, 16, 17, 18, 19, 20, 21, 22, 23, 24, 25, 26

## 62533020621
designator J?
WR-BHD Box Header, Male PCB side, pitch 2.00mm, SMT, Straight, 30p; Manufacturer Part Number: 62533020621; Manufacturer: Wurth Elektronik; Pin Number: 30; Working Voltage: 250VAC; Withstanding Voltage: 500VAC; Contact Resistance: 20mOhm; Insulation Resistance: 1000MOhm; Rated Current: 2A; ComponentLink1Description: Manufacturer; ComponentLink1URL: http://www.we-online.de; ComponentLink2Description: Datasheet; ComponentLink2URL: https://www.we-online.com/catalog/datasheet/62533020621.pdf; Published Date: August 2021; Pitch: 2.00mm; Operating Temperature: -40 to +105degC; Packaging: Tape and Reel with Cap; Gender: Male PCB side; Mounting Technology: SMT; Type: Straight; Length: 37.25mm
footprint 62533020621
pins: 1, 2, 3, 4, 5, 6, 7, 8, 9, 10, 11, 12, 13, 14, 15, 16, 17, 18, 19, 20, 21, 22, 23, 24, 25, 26, 27, 28, 29, 30

## 62533420621
designator J?
WR-BHD Box Header, Male PCB side, pitch 2.00mm, SMT, Straight, 34p; Manufacturer Part Number: 62533420621; Manufacturer: Wurth Elektronik; Pin Number: 34; Working Voltage: 250VAC; Withstanding Voltage: 500VAC; Contact Resistance: 20mOhm; Insulation Resistance: 1000MOhm; Rated Current: 2A; ComponentLink1Description: Manufacturer; ComponentLink1URL: http://www.we-online.de; ComponentLink2Description: Datasheet; ComponentLink2URL: https://www.we-online.com/catalog/datasheet/62533420621.pdf; Published Date: August 2021; Pitch: 2.00mm; Operating Temperature: -40 to +105degC; Packaging: Tape and Reel with Cap; Gender: Male PCB side; Mounting Technology: SMT; Type: Straight; Length: 41.25mm
footprint 62533420621
pins: 1, 2, 3, 4, 5, 6, 7, 8, 9, 10, 11, 12, 13, 14, 15, 16, 17, 18, 19, 20, 21, 22, 23, 24, 25, 26, 27, 28, 29, 30, 31, 32, 33, 34

## 62534020621
designator J?
WR-BHD Box Header, Male PCB side, pitch 2.00mm, SMT, Straight, 40p; Manufacturer Part Number: 62534020621; Manufacturer: Wurth Elektronik; Pin Number: 40; Working Voltage: 250VAC; Withstanding Voltage: 500VAC; Contact Resistance: 20mOhm; Insulation Resistance: 1000MOhm; Rated Current: 2A; ComponentLink1Description: Manufacturer; ComponentLink1URL: http://www.we-online.de; ComponentLink2Description: Datasheet; ComponentLink2URL: https://www.we-online.com/catalog/datasheet/62534020621.pdf; Published Date: August 2021; Pitch: 2.00mm; Operating Temperature: -40 to +105degC; Packaging: Tape and Reel with Cap; Gender: Male PCB side; Mounting Technology: SMT; Type: Straight; Length: 47.25mm
footprint 62534020621
pins: 1, 2, 3, 4, 5, 6, 7, 8, 9, 10, 11, 12, 13, 14, 15, 16, 17, 18, 19, 20, 21, 22, 23, 24, 25, 26, 27, 28, 29, 30, 31, 32, 33, 34, 35, 36, 37, 38, 39, 40

## 62534420621
designator J?
WR-BHD Box Header, Male PCB side, pitch 2.00mm, SMT, Straight, 44p; Manufacturer Part Number: 62534420621; Manufacturer: Wurth Elektronik; Pin Number: 44; Working Voltage: 250VAC; Withstanding Voltage: 500VAC; Contact Resistance: 20mOhm; Insulation Resistance: 1000MOhm; Rated Current: 2A; ComponentLink1Description: Manufacturer; ComponentLink1URL: http://www.we-online.de; ComponentLink2Description: Datasheet; ComponentLink2URL: https://www.we-online.com/catalog/datasheet/62534420621.pdf; Published Date: August 2021; Pitch: 2.00mm; Operating Temperature: -40 to +105degC; Packaging: Tape and Reel with Cap; Gender: Male PCB side; Mounting Technology: SMT; Type: Straight; Length: 51.25mm
footprint 62534420621
pins: 1, 2, 3, 4, 5, 6, 7, 8, 9, 10, 11, 12, 13, 14, 15, 16, 17, 18, 19, 20, 21, 22, 23, 24, 25, 26, 27, 28, 29, 30, 31, 32, 33, 34, 35, 36, 37, 38, 39, 40, 41, 42, 43, 44

## 62535020621
designator J?
WR-BHD Box Header, Male PCB side, pitch 2.00mm, SMT, Straight, 50p; Manufacturer Part Number: 62535020621; Manufacturer: Wurth Elektronik; Pin Number: 50; Working Voltage: 250VAC; Withstanding Voltage: 500VAC; Contact Resistance: 20mOhm; Insulation Resistance: 1000MOhm; Rated Current: 2A; ComponentLink1Description: Manufacturer; ComponentLink1URL: http://www.we-online.de; ComponentLink2Description: Datasheet; ComponentLink2URL: https://www.we-online.com/catalog/datasheet/62535020621.pdf; Published Date: August 2021; Pitch: 2.00mm; Operating Temperature: -40 to +105degC; Packaging: Tape and Reel with Cap; Gender: Male PCB side; Mounting Technology: SMT; Type: Straight; Length: 57.25mm
footprint 62535020621
pins: 1, 2, 3, 4, 5, 6, 7, 8, 9, 10, 11, 12, 13, 14, 15, 16, 17, 18, 19, 20, 21, 22, 23, 24, 25, 26, 27, 28, 29, 30, 31, 32, 33, 34, 35, 36, 37, 38, 39, 40, 41, 42, 43, 44, 45, 46, 47, 48, 49, 50

